# Altium integrated library SubjuGator8.IntLib: 306 symbols (part 2 of 2)
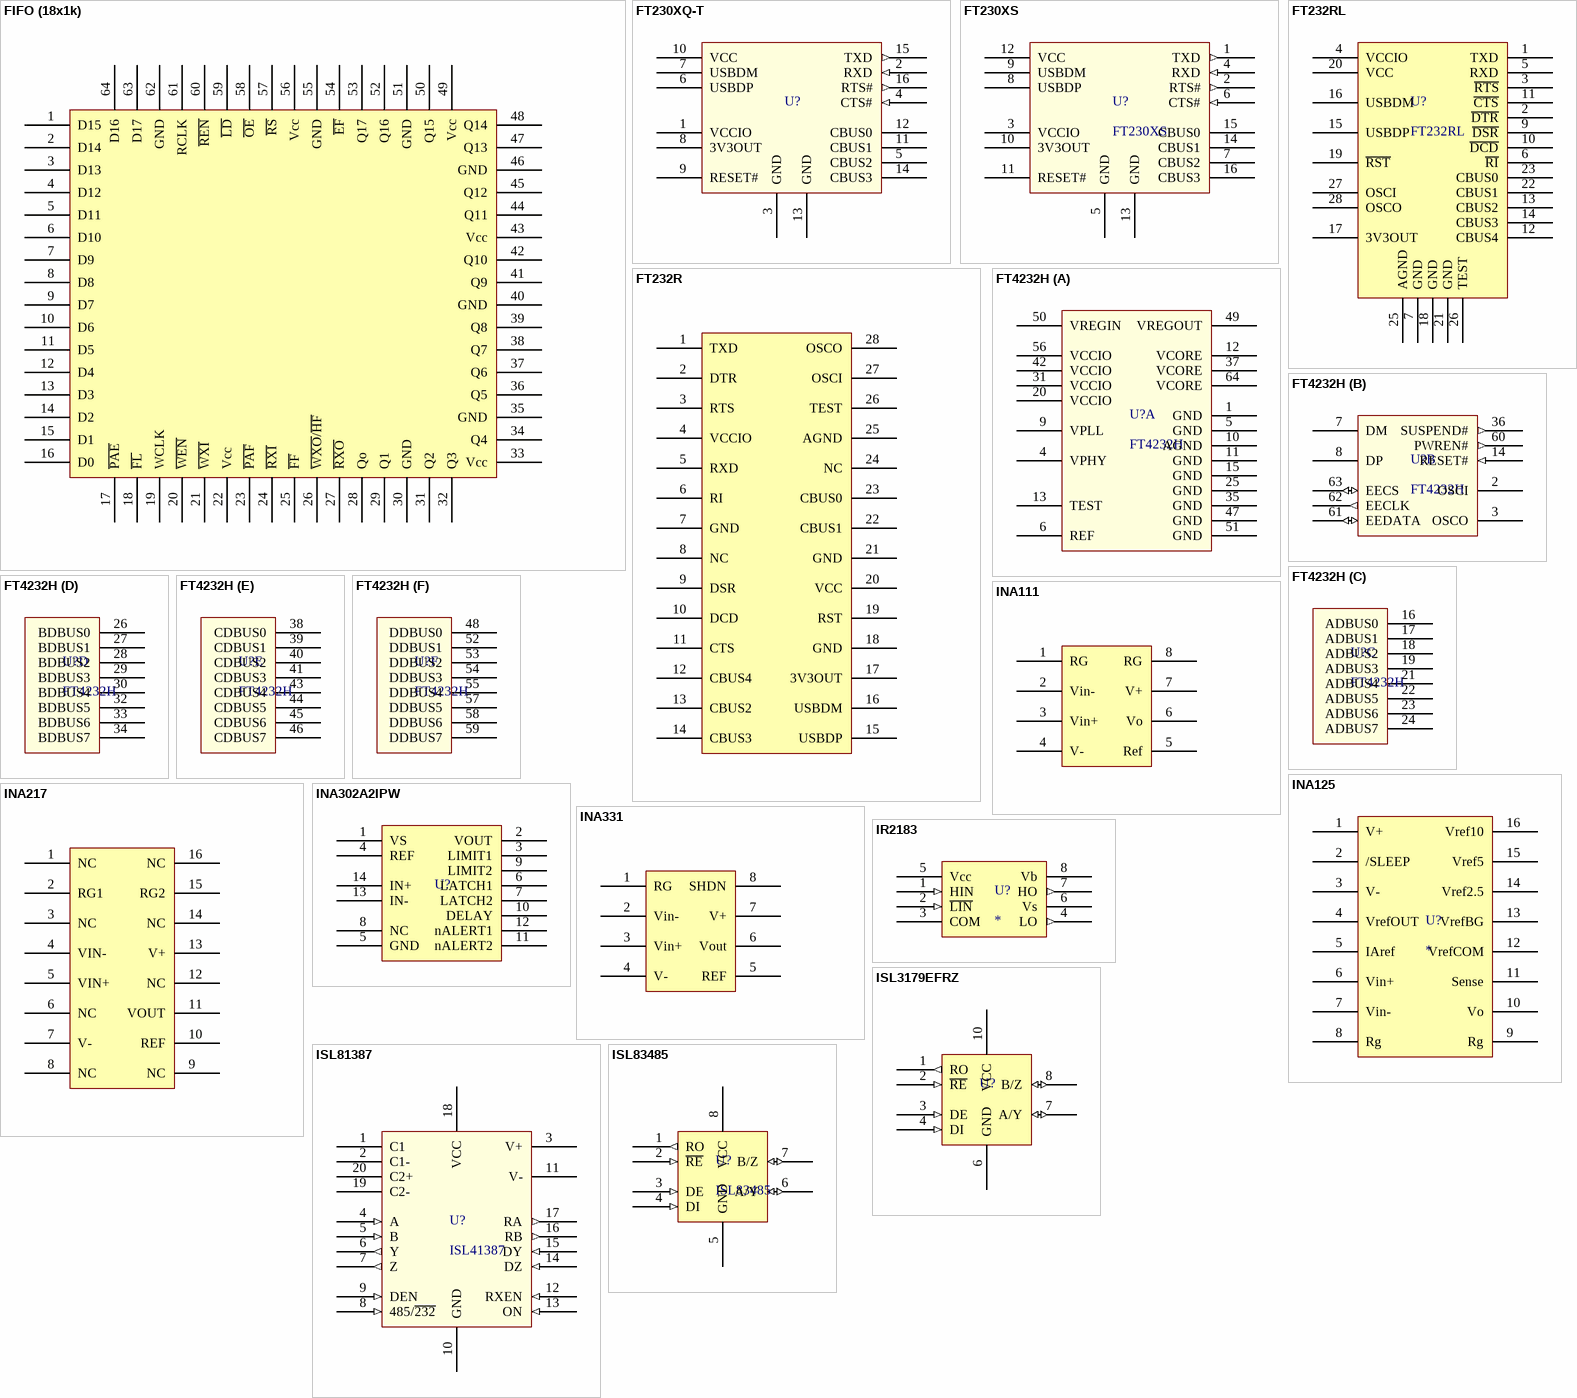
[diagram p15: symbols FIFO (18x1k) to ISL83485]

## FT4232H
designator U?
Quad High Speed USB to Multipurpose UART/MPSSE; Supplier 1: Digi-Key; Supplier Part Number 1: 768-1026-1-ND
footprint FT4232HL (TSQFP, 64-Leads, Body 10.00x10.00mm, Pitch 0.50mm, IPC Medium Density)
part A pins: 1 GND (power), 4 VPHY (power), 5 GND (power), 6 REF, 9 VPLL (power), 10 AGND (power), 11 GND (power), 12 VCORE (power), 13 TEST, 15 GND (power), 20 VCCIO (power), 25 GND (power), 31 VCCIO (power), 35 GND (power), 37 VCORE (power), 42 VCCIO (power), 47 GND (power), 49 VREGOUT (power), 50 VREGIN (power), 51 GND (power), 56 VCCIO (power), 64 VCORE (power)
part B pins: 2 OSCI, 3 OSCO, 7 DM, 8 DP, 14 RESET# (in), 36 SUSPEND# (out), 60 PWREN# (out), 61 EEDATA (io), 62 EECLK (out), 63 EECS (io)
part C pins: 16 ADBUS0, 17 ADBUS1, 18 ADBUS2, 19 ADBUS3, 21 ADBUS4, 22 ADBUS5, 23 ADBUS6, 24 ADBUS7
part D pins: 26 BDBUS0, 27 BDBUS1, 28 BDBUS2, 29 BDBUS3, 30 BDBUS4, 32 BDBUS5, 33 BDBUS6, 34 BDBUS7
part E pins: 38 CDBUS0, 39 CDBUS1, 40 CDBUS2, 41 CDBUS3, 43 CDBUS4, 44 CDBUS5, 45 CDBUS6, 46 CDBUS7
part F pins: 48 DDBUS0, 52 DDBUS1, 53 DDBUS2, 54 DDBUS3, 55 DDBUS4, 57 DDBUS5, 58 DDBUS6, 59 DDBUS7

## INA111
designator U?, comment Instr. Amp
IC OPAMP INSTR 2MHZ 8DIP; Supplier 1: Digi-Key; Supplier Part Number 1: INA111AP-ND
footprint DIP8
pins: 1 RG, 2 Vin-, 3 Vin+, 4 V-, 5 Ref, 6 Vo, 7 V+, 8 RG

## INA125
designator U?
Instrumentation Amplifier; Supplier 1: Digi-Key; Supplier Part Number 1: INA125UA-ND
footprint SOIC127P600X175-16N (SOIC, 16-Leads, Body 9.90x3.90mm, Pitch 1.27mm, IPC Medium Density)
pins: 1 V+, 2 /SLEEP, 3 V-, 4 VrefOUT, 5 IAref, 6 Vin+, 7 Vin-, 8 Rg, 9 Rg, 10 Vo, 11 Sense, 12 VrefCOM, 13 VrefBG, 14 Vref2.5, 15 Vref5, 16 Vref10

## INA217
designator U?
IC OPAMP INSTR 3.4MHZ 16SOIC; Supplier 1: Digi-Key; Supplier Part Number 1: 296-13645-1-ND
footprint SOIC-16
pins: 1 NC, 2 RG1, 3 NC, 4 VIN-, 5 VIN+, 6 NC, 7 V-, 8 NC, 9 NC, 10 REF, 11 VOUT, 12 NC, 13 V+, 14 NC, 15 RG2, 16 NC

## INA302A2IPW
designator U?, comment INA302A2  (value not drawn)
IC CURRENT SENSING AMP 14TSSOP; Manufacturer 1: Texas Instruments; Manufacturer Part Number 1: INA302A2IPW; Supplier 1: Digi-Key; Supplier Part Number 1: 296-46938-ND
footprint INA302A2IPW (IC CURRENT SENSING AMP 14TSSOP)
pins: 1 VS, 2 VOUT, 3 LIMIT1, 4 REF, 5 GND, 6 LATCH1, 7 LATCH2, 8 NC, 9 LIMIT2, 10 DELAY, 11 nALERT2, 12 nALERT1, 13 IN-, 14 IN+

## INA331
designator U?, comment Inst. Amp
IC OPAMP INSTR 2MHZ RRO 8VSSOP; Suplier Part Number 1: 296-12202-1-ND; Supplier 1: Digi-Key
footprint TSSOP-8n
pins: 1 RG, 2 Vin-, 3 Vin+, 4 V-, 5 REF, 6 Vout, 7 V+, 8 SHDN

## IR2183
designator U?
Half-Bridge Driver; Supplier 1: Digi-Key; Supplier Part Number 1: IR2183SPBF-ND
footprint IR2183S
pins: 1 HIN (in), 2 ~{LIN} (in), 3 COM (power), 4 LO (out), 5 Vcc (power), 6 Vs (power), 7 HO (out), 8 Vb

## ISL3179EFRZ
designator U?  (value not drawn)
TXRX ESD 3.3V RS-485/422 10-DFN; Supplier 1: Digi-Key; Supplier Part Number 1: ISL3179EFRZ-ND
footprint ISL3179EFRZ (TXRX ESD 3.3V RS-485/422 10-DFN)
footprint ISL3179EFRZ_NO_VIAS (TXRX ESD 3.3V RS-485/422 10-DFN)
pins: 1 RO (out), 2 ~{RE} (in), 3 DE (in), 4 DI (in), 6 GND (power), 7 A/Y (io), 8 B/Z (io), 10 VCC (power)

## ISL81387
designator U?, comment ISL41387
5V RS-232/RS-485 Transceiver
footprint ISL81387IAZ (SOP, 20-Leads, Body 7.3x5.4mm (max), Pitch 0.65mm, IPC Medium Density)
pins: 1 C1, 2 C1-, 3 V+, 4 A (in), 5 B (in), 6 Y (out), 7 Z (out), 8 485/~{232} (in), 9 DEN (in), 10 GND (power), 11 V-, 12 RXEN (in), 13 ON (in), 14 DZ (in), 15 DY (in), 16 RB (out), 17 RA (out), 18 VCC (power), 19 C2-, 20 C2+

## ISL83485
designator U?
3.3V RS485 Transceiver; Supplier 1: Digi-Key; Supplier Part Number 1: ISL83485IBZ-ND
footprint ISL8348xIBZ (SOIC, 8-Leads, Body 4.90x3.90mm, Pitch 1.27mm, IPC Medium Density)
pins: 1 RO (out), 2 ~{RE} (in), 3 DE (in), 4 DI (in), 5 GND (power), 6 A/Y (io), 7 B/Z (io), 8 VCC (power)

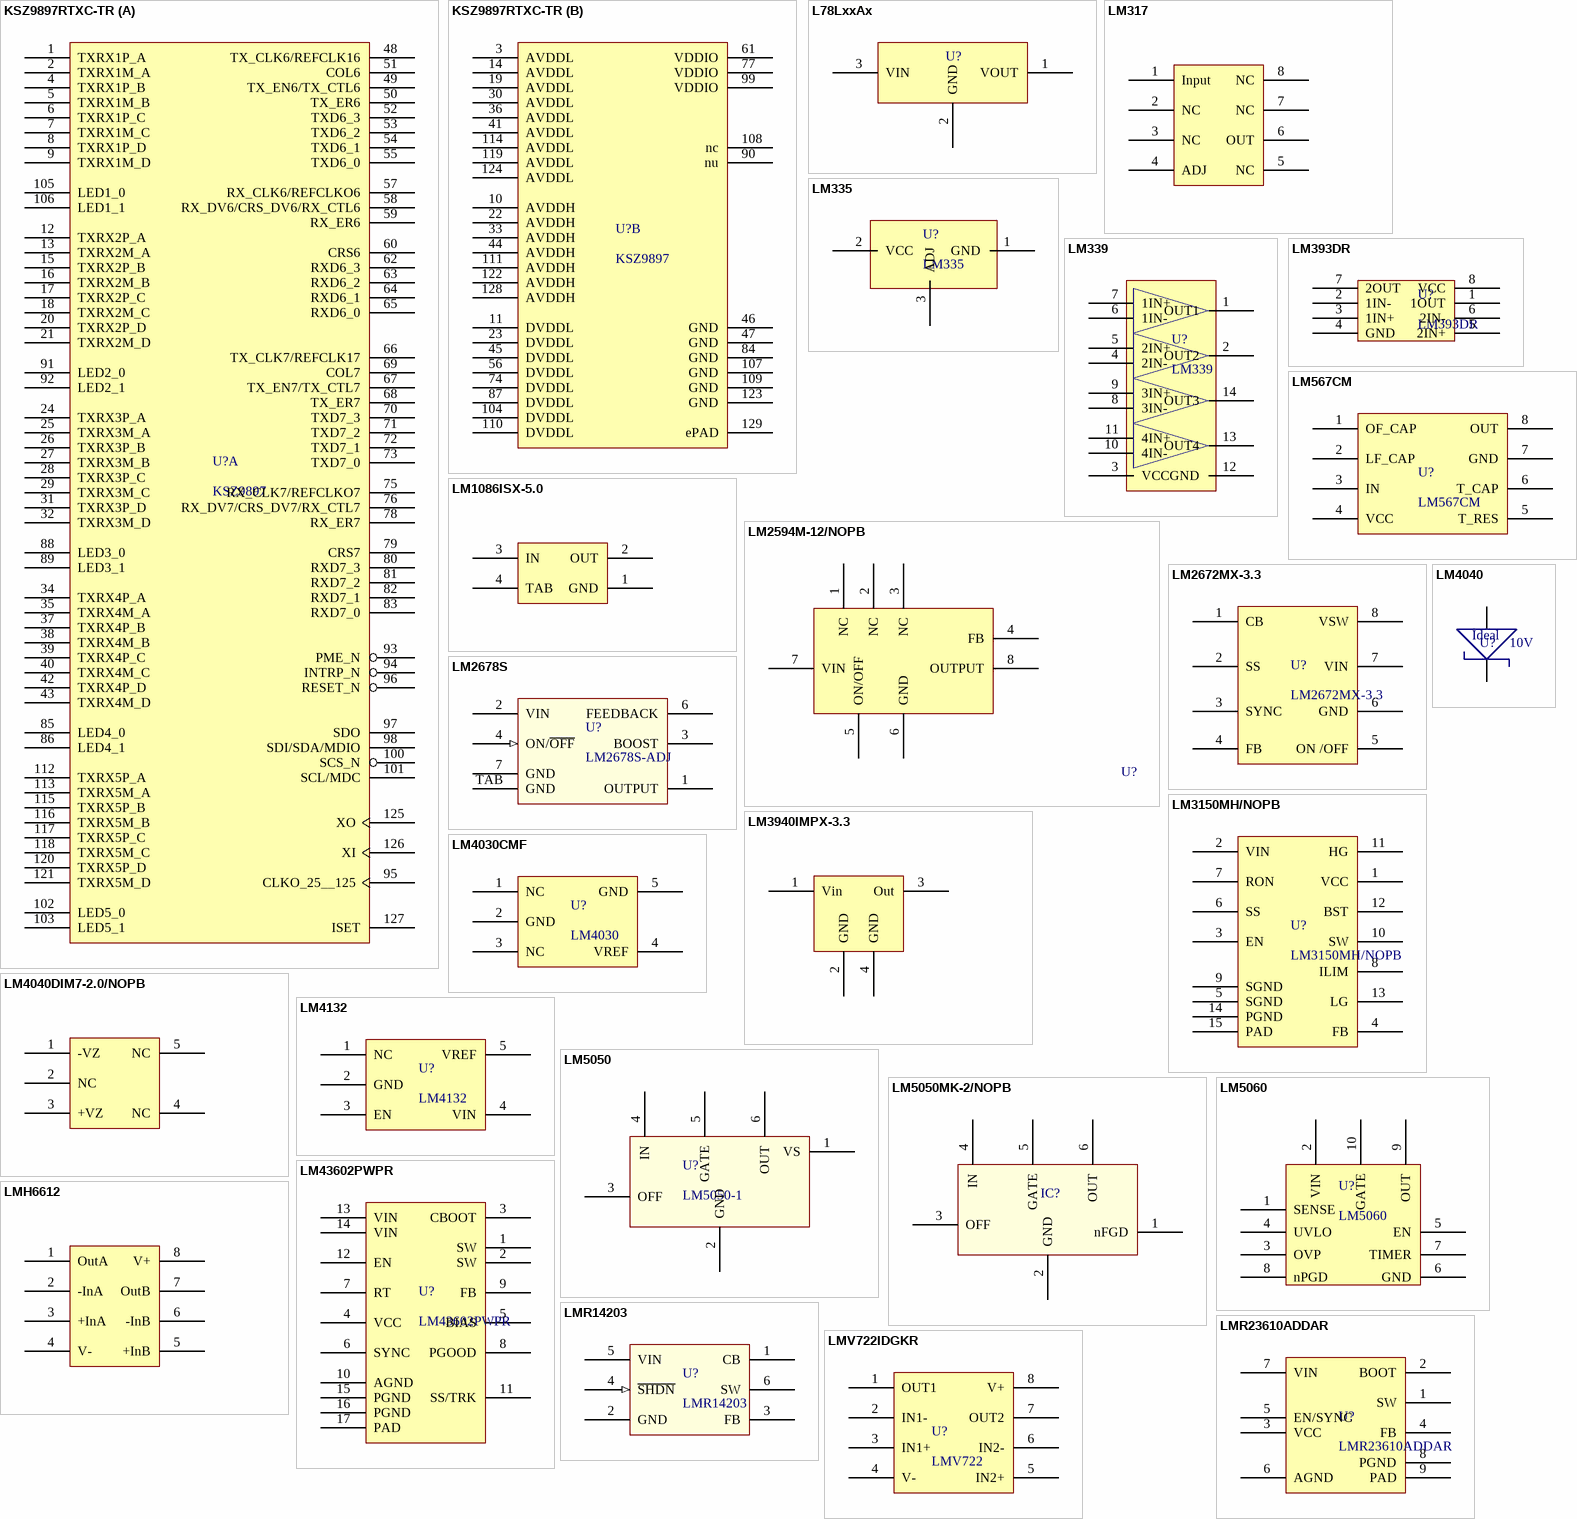
[diagram p6: symbols KSZ9897RTXC-TR to LMV722IDGKR]

## KSZ9897RTXC-TR
designator U?, comment KSZ9897
Ethernet Switch 10/100/1000 Base-T PHY I²C, SPI Interface 128-TQFP (14x14); Supplier 1: Digi-Key; Supplier Part Number 1: KSZ9897RTXC-CT-ND
footprint 128-TQFP (TSQFP, 128-Leads, Body 14.00x14.00mm, Pitch 0.40mm, Thermal Pad 6.50x6.50mm, IPC Medium Density)
part A pins: 1 TXRX1P_A, 2 TXRX1M_A, 4 TXRX1P_B, 5 TXRX1M_B, 6 TXRX1P_C, 7 TXRX1M_C, 8 TXRX1P_D, 9 TXRX1M_D, 12 TXRX2P_A, 13 TXRX2M_A, 15 TXRX2P_B, 16 TXRX2M_B, 17 TXRX2P_C, 18 TXRX2M_C, 20 TXRX2P_D, 21 TXRX2M_D, 24 TXRX3P_A, 25 TXRX3M_A, 26 TXRX3P_B, 27 TXRX3M_B, 28 TXRX3P_C, 29 TXRX3M_C, 31 TXRX3P_D, 32 TXRX3M_D, 34 TXRX4P_A, 35 TXRX4M_A, 37 TXRX4P_B, 38 TXRX4M_B, 39 TXRX4P_C, 40 TXRX4M_C, 42 TXRX4P_D, 43 TXRX4M_D, 48 TX_CLK6/REFCLK16, 49 TX_EN6/TX_CTL6, 50 TX_ER6, 51 COL6, 52 TXD6_3, 53 TXD6_2, 54 TXD6_1, 55 TXD6_0, 57 RX_CLK6/REFCLKO6, 58 RX_DV6/CRS_DV6/RX_CTL6, 59 RX_ER6, 60 CRS6, 62 RXD6_3, 63 RXD6_2, 64 RXD6_1, 65 RXD6_0, 66 TX_CLK7/REFCLK17, 67 TX_EN7/TX_CTL7, 68 TX_ER7, 69 COL7, 70 TXD7_3, 71 TXD7_2, 72 TXD7_1, 73 TXD7_0, 75 RX_CLK7/REFCLKO7, 76 RX_DV7/CRS_DV7/RX_CTL7, 78 RX_ER7, 79 CRS7, 80 RXD7_3, 81 RXD7_2, 82 RXD7_1, 83 RXD7_0, 85 LED4_0, 86 LED4_1, 88 LED3_0, 89 LED3_1, 91 LED2_0, 92 LED2_1, 93 PME_N, 94 INTRP_N, 95 CLKO_25__125, 96 RESET_N, 97 SDO, 98 SDI/SDA/MDIO, 100 SCS_N, 101 SCL/MDC, 102 LED5_0, 103 LED5_1, 105 LED1_0, 106 LED1_1, 112 TXRX5P_A, 113 TXRX5M_A, 115 TXRX5P_B, 116 TXRX5M_B, 117 TXRX5P_C, 118 TXRX5M_C, 120 TXRX5P_D, 121 TXRX5M_D, 125 XO, 126 XI, 127 ISET
part B pins: 3 AVDDL, 10 AVDDH, 11 DVDDL, 14 AVDDL, 19 AVDDL, 22 AVDDH, 23 DVDDL, 30 AVDDL, 33 AVDDH, 36 AVDDL, 41 AVDDL, 44 AVDDH, 45 DVDDL, 46 GND, 47 GND, 56 DVDDL, 61 VDDIO, 74 DVDDL, 77 VDDIO, 84 GND, 87 DVDDL, 90 nu, 99 VDDIO, 104 DVDDL, 107 GND, 108 nc, 109 GND, 110 DVDDL, 111 AVDDH, 114 AVDDL, 119 AVDDL, 122 AVDDH, 123 GND, 124 AVDDL, 128 AVDDH, 129 ePAD

## L78LxxAx
designator U?, comment L78L15AC  (value not drawn)
Positive Voltage Regulator; Supplier 1: Digi-Key; Supplier Part Number 1: 497-13129-ND
footprint L78LxxAxZ (Positive voltage regulator TO-92)
footprint L78LxxAxUTR (SOT89, 3-Leads, Body 4.50x2.45mm, Pitch 1.50mm, Lead Span 4.1mm, IPC Medium Density)
pins: 1 VOUT, 2 GND (power), 3 VIN

## LM317
designator U?
IC REG LDO ADJ 0.1A 8SOIC; Supplier 1: Digi-Key; Supplier Part Number 1: 296-26092-5-ND
footprint SOIC-8N (LM317 Footprint)
pins: 1 Input, 2 NC, 3 NC, 4 ADJ, 5 NC, 6 OUT, 7 NC, 8 NC

## LM335
designator U?
IC SENSOR PRECISION TEMP TO92-3; Supplier: Digikey; Supplier Part Number: LM335ZNS/NOPB-ND
footprint LM335 (IC SENSOR PRECISION TEMP TO92-3)
pins: 1 GND, 2 VCC, 3 ADJ

## LM339
designator U?
IC QUAD DIFF COMPARATOR 14-TSSOP; Supplier 1: Digi-Key; Supplier Part Number 1: 296-18454-1-ND
footprint LM339 (TSOP, 14-Leads, Body 5.00x4.40mm, Pitch 0.65mm, IPC Medium Density)
pins: 1 OUT1, 2 OUT2, 3 VCC, 4 2IN-, 5 2IN+, 6 1IN-, 7 1IN+, 8 3IN-, 9 3IN+, 10 4IN-, 11 4IN+, 12 GND, 13 OUT4, 14 OUT3

## LM393DR
designator U?
LM393DR Comparator; Supplier 1: Digi-key; Supplier Part Number 1: 296-1015-1-ND
footprint LM393DR
pins: 1 1OUT, 2 1IN-, 3 1IN+, 4 GND, 5 2IN+, 6 2IN-, 7 2OUT, 8 VCC

## LM567CM
designator U?
IC TONE DECODR PHAS LOC LP 8SOIC; Supplier Part Number 1: LM567CM/NOPB-ND; Supplier 1: Digi-Key
footprint SOIC-8PIN (For 296-1345-1-ND)
pins: 1 OF_CAP, 2 LF_CAP, 3 IN, 4 VCC, 5 T_RES, 6 T_CAP, 7 GND, 8 OUT

## LM1086ISX-5.0
designator U?, comment 5V LDO Regulator
IC REG LDO 5V 1.5A DDPAK; Supplier Part Number 1: LM1086ISX-5.0/NOPBCT-ND; Supplier 1: Digi-Key
footprint DPAK254P1435X464-4N (D2-PAK, 4-Pads, Body 7.55x8.56mm (max), IPC Medium Density)
pins: 1 GND, 2 OUT, 3 IN, 4 TAB

## LM2594M-12/NOPB
designator U?  (value not drawn)
IC REG BUCK 12V 0.5A 8-SOIC; Supplier 1: Digi-Key; Supplier Part Number 1: LM2594M-12/NOPB-ND
footprint LM2594M-12/NOPB (IC REG BUCK 12V 0.5A 8-SOIC)
pins: 1 NC, 2 NC, 3 NC, 4 FB, 5 ON/OFF, 6 GND, 7 VIN, 8 OUTPUT

## LM2672MX-3.3
designator U?
IC REG BUCK 3.3V 1A 8-SOIC; Manufacturer: Microchip; Manufacturer Part Number: LM2672MX-3.3; Supplier 1: Digi-Key; Supplier 1 Part Number: 296-35408-1-ND
footprint 8-SOIC (Used for LMH6612)
pins: 1 CB, 2 SS, 3 SYNC, 4 FB, 5 ON /OFF, 6 GND, 7 VIN, 8 VSW

## LM2678S
designator U?, comment LM2678S-ADJ
Simple Switcher High Efficiency 5A Step-Down Voltage Regulator; Supplier 1: Digi-Key; Supplier Part Number 1: LM2678SX-ADJ/NOPBCT-ND
footprint LM2678S
pins: 1 OUTPUT, 2 VIN (power), 3 BOOST, 4 ON/~{OFF} (in), 6 FEEDBACK (power), 7 GND (power), TAB GND (power)

## LM3150MH/NOPB
designator U?
IC REG CTRLR BUCK 14TSSOP; Manufacturer 1: Texas Instruments; Manufacturer Part Number 1: LM3150MH/NOPB; Supplier Part Number 1: LM3150MH/NOPB-ND; Supplier 1: Digi-Key
footprint TSSOP-14 EP (TSOP, 14-Leads, Body 5.00x4.40mm, Pitch 0.65mm, Thermal Pad 3.10x3.00mm, IPC Medium Density)
pins: 1 VCC, 2 VIN, 3 EN, 4 FB, 5 SGND, 6 SS, 7 RON, 8 ILIM, 9 SGND, 10 SW, 11 HG, 12 BST, 13 LG, 14 PGND, 15 PAD

## LM3940IMPX-3.3
designator U?, comment 3.3V LDO Reg
IC REG LDO 3.3V 1A SOT223; Supplier 1: Digi-Key; Supplier Part Number 1: LM3940IMPX-3.3/NOPBCT-ND
footprint SOT23-4n (SOT223, 4-Leads, Body 6.50x7.00mm (avg), Pitch 2.30mm, IPC Medium Density)
pins: 1 Vin, 2 GND, 3 Out, 4 GND

## LM4030CMF
designator U?, comment LM4030
LM4030CMF-2.5/NOPB; Supplier 1: Digi-Key; Supplier Part Number 1: LM4030CMF-2.5/NOPBCT-ND
footprint SOT23-5 (Used for LP2992)
pins: 1 NC, 2 GND, 3 NC, 4 VREF, 5 GND

## LM4040
designator U?  Reverse Breakdown Voltage: 10V  (hidden comment: LM4040)
LM4040AIM3-10.0/NOPBCT; Supplier 1: Digi-Key; Supplier Part Number 1: LM4040AIM3-10.0/NOPBCT-ND
footprint LM4040 (SOT23, 3-Leads, Body 2.92x2.37mm, Pitch 0.95mm, IPC Medium Density)
pins: 1 Anode, 2 Cathode
text: Ideal

## LM4040DIM7-2.0/NOPB
designator U?, comment VRef 2.048V
IC VREF SHUNT 2.048V SC70; Supplier 1: Digi-Key; Supplier Part Number 1: 296-38736-1-ND
footprint SOT35-5pin (For 296-38736-1-ND)
pins: 1 -VZ, 2 NC, 3 +VZ, 4 NC, 5 NC

## LM4132
designator U?
IC VREF SERIES 2.5V SOT23-5; Supplier 1: Digi-Key; Supplier Part Number 1: LM4132AMF-2.5/NOPBCT-ND
footprint SOT23-5 (Used for LP2992)
pins: 1 NC, 2 GND, 3 EN, 4 VIN, 5 VREF

## LM5050
designator U?, comment LM5050-1
High-Side OR-ing FET Controller; Supplier 1: Digi-Key; Supplier Part Number 1: LM5050MK-1/NOPBCT-ND
footprint LM5050 (SOT23, 6-Leads, Body 2.90x2.80mm, Pitch 0.95mm, IPC Medium Density)
pins: 1 VS, 2 GND, 3 OFF, 4 IN, 5 GATE, 6 OUT

## LM5050MK-2/NOPB
designator IC?  (value not drawn)
IC OR CTRLR N+1 6SOT; Supplier 1: Digi-Key; Supplier Part Number 1: LM5050MK-2/NOPBDKR-ND
footprint LM5050MK-2/NOPB (IC OR CTRLR N+1 6SOT)
pins: 1 nFGD, 2 GND, 3 OFF, 4 IN, 5 GATE, 6 OUT

## LM5060
designator U?
Hotswap Controller; Supplier 1: Digi-Key; Supplier Part Number 1: LM5060Q1MM/NOPBCT-ND
footprint LM5060 (10-VSSOP)
pins: 1 SENSE, 2 VIN, 3 OVP, 4 UVLO, 5 EN, 6 GND, 7 TIMER, 8 nPGD, 9 OUT, 10 GATE

## LM43602PWPR
designator U?
IC REG BUCK ADJ 2A SYNC 16HTSSOP; Manufacturer 1: Texas Instruments; Manufacturer Part Number 1: LM43602PWPR; Supplier Part Number 1: 296-37754-1-ND; Supplier 1: Digi-Key
footprint TSSOP-16 EP (TSOP, 16-Leads, Body 5.00x4.40mm, Pitch 0.65mm, Thermal Pad 3.29x2.41mm, IPC Medium Density)
pins: 1 SW, 2 SW, 3 CBOOT, 4 VCC, 5 BIAS, 6 SYNC, 7 RT, 8 PGOOD, 9 FB, 10 AGND, 11 SS/TRK, 12 EN, 13 VIN, 14 VIN, 15 PGND, 16 PGND, 17 PAD

## LMH6612
designator U?
IC OPAMP GP 130MHZ RRO 8SOIC; Supplier Part Number 1: LMH6612MA/NOPB-ND; Supplier 1: Digi-Key
footprint 8-SOIC (Used for LMH6612)
pins: 1 OutA, 2 -InA, 3 +InA, 4 V-, 5 +InB, 6 -InB, 7 OutB, 8 V+

## LMR14203
designator U?
Simple Switcher 42Vin 0.3A Step-Down Voltage Regulator; Supplier 1: Digi-Key; Supplier Part Number 1: LMR14203XMKE/NOPBCT-ND
footprint SOT95P280X110-6N (SOT23, 6-Leads, Body 2.90x2.80mm, Pitch 0.95mm, IPC Medium Density)
pins: 1 CB, 2 GND (power), 3 FB, 4 ~{SHDN} (in), 5 VIN, 6 SW

## LMR23610ADDAR
designator U?
IC REG BUCK ADJ 1A SYNC 8SOPWRPD; Manufacturer 1: Texas Instruments; Supplier 1: Digi-Key; Supplier Part Number 1: 296-47267-1-ND; Manufacturer Part Number 1: LMR23610ADDAR; ComponentLink1URL: http://www.ti.com/lit/ds/symlink/lmr23610.pdf; ComponentLink1Description: Datasheet; ComponentLink2URL: http://www.ti.com/product/LMR23610/description; ComponentLink2Description: Web Site
footprint LMR23610ADDAR (IC REG BUCK ADJ 1A SYNC 8SOPWRPD)
footprint LMR23610ADDAR (IC REG BUCK ADJ 1A SYNC 8SOPWRPD)
pins: 1 SW, 2 BOOT, 3 VCC, 4 FB, 5 EN/SYNC, 6 AGND, 7 VIN, 8 PGND, 9 PAD

## LMV722IDGKR
designator U?, comment LMV722
IC OPAMP GP 10MHZ RRO 8VSSOP; Supplier 1: Digi-Key; Supplier Part Number 1: 296-27988-1-ND
footprint TSSOP-8N(2) (For LMV722)
pins: 1 OUT1, 2 IN1-, 3 IN1+, 4 V-, 5 IN2+, 6 IN2-, 7 OUT2, 8 V+

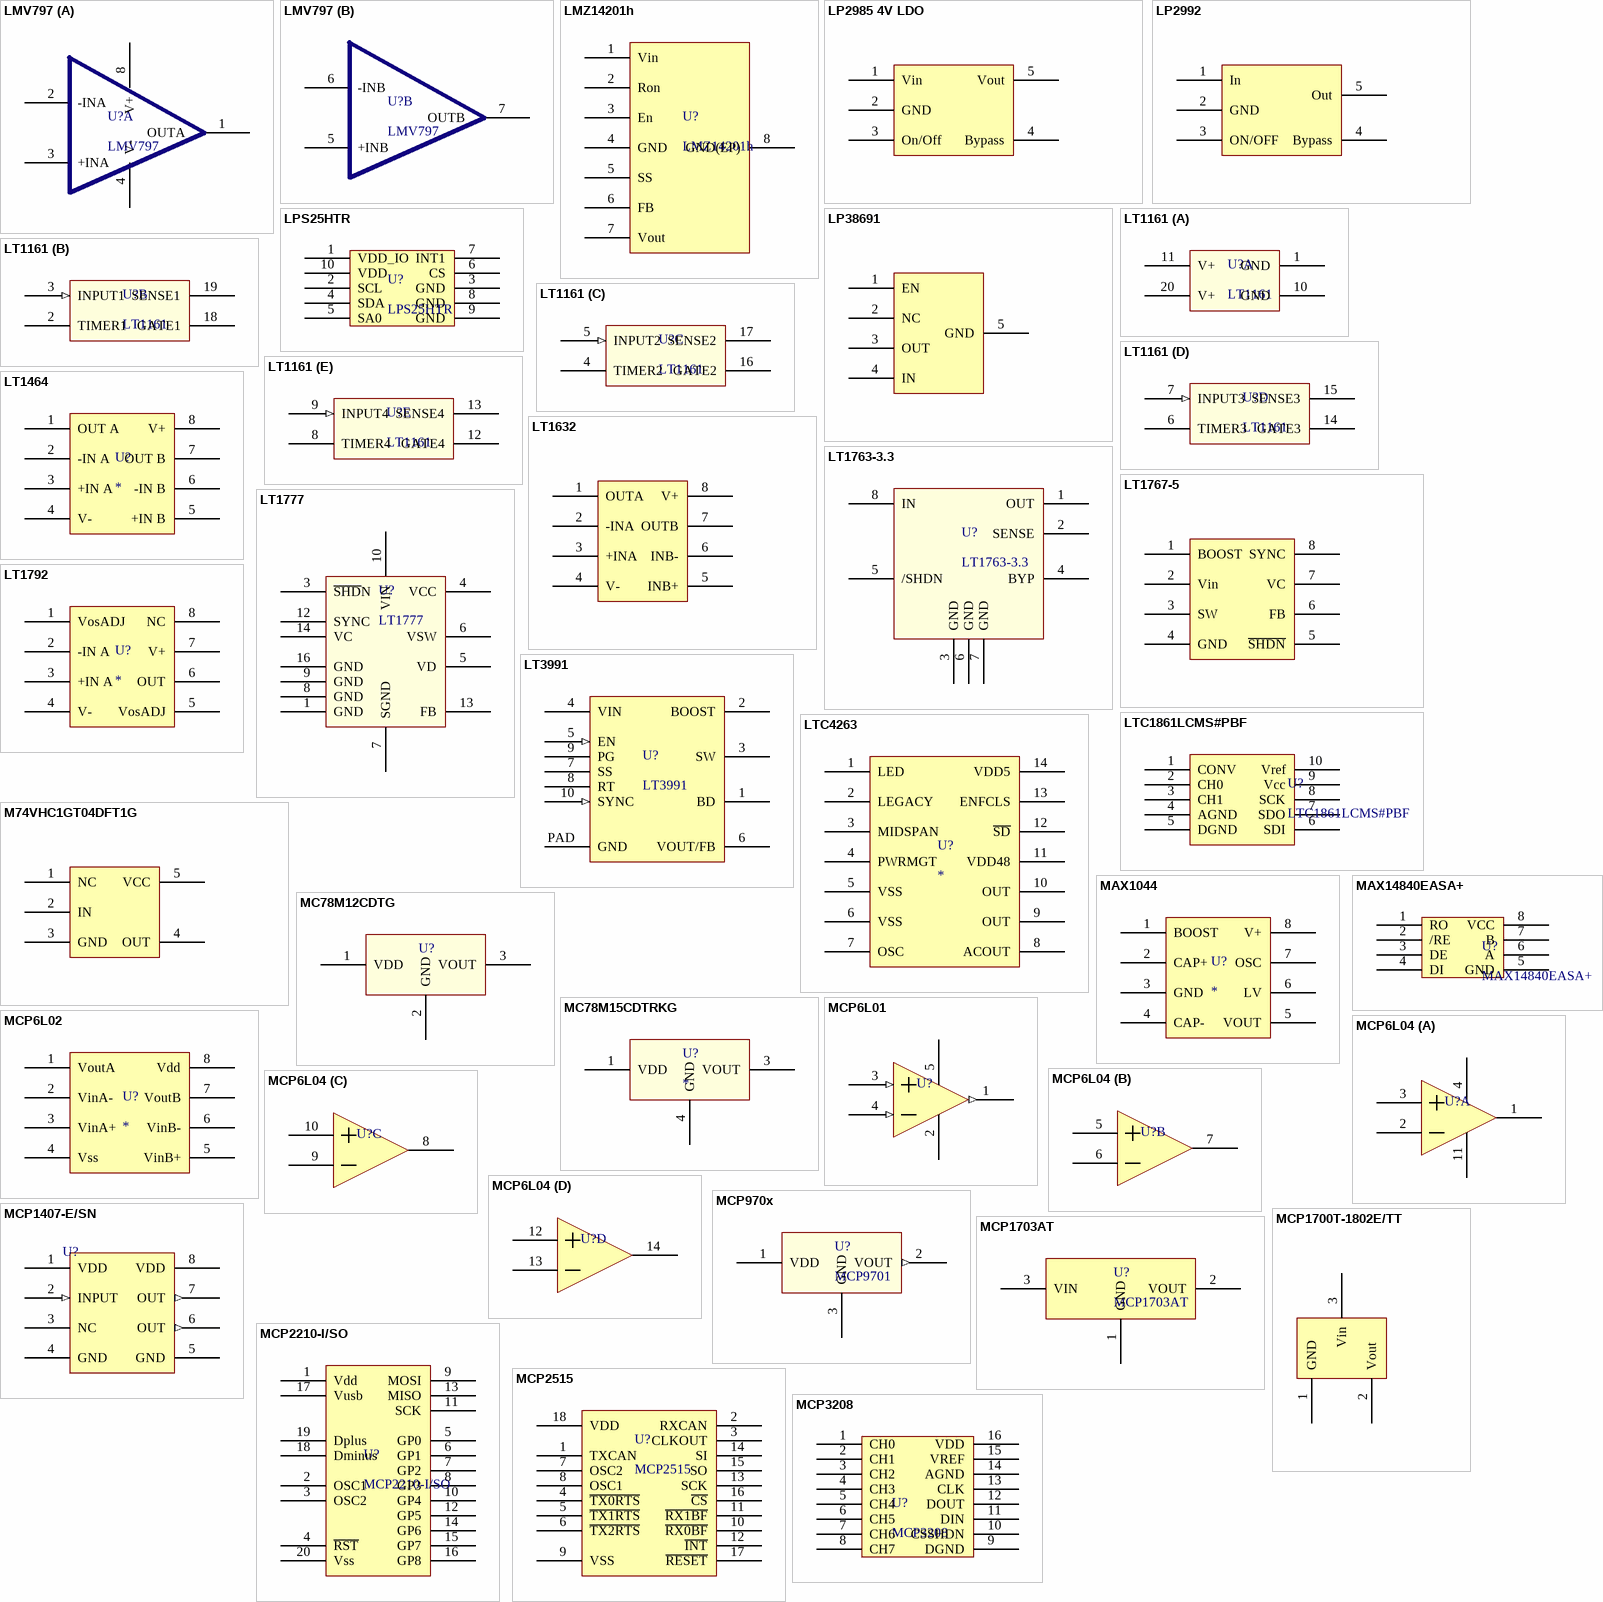
[diagram p7: symbols LMV797 to MCP3208]

## LMV797
designator U?
IC OPAMP GP 17MHZ RRO 8VSSOP; Supplier 1: Digi-Key; Supplier Part Number 1: LMV797MM/NOPBCT-ND
footprint TSSOP-8N
part A pins: 1 OUTA   , 2 -INA, 3 +INA, 4 V-, 8 V+
part B pins: 5 +INB, 6 -INB, 7 OUTB   

## LMZ14201h
designator U?
IC BUCK SYNC ADJ 1A TO-PMOD-7; Supplier 1: Digi-Key; Supplier Part Number 1: LMZ14201HTZX/NOPBCT-ND
footprint TO-PMOD-7 (For LMZ14201h)
pins: 1 Vin, 2 Ron, 3 En, 4 GND, 5 SS, 6 FB, 7 Vout, 8 GND(EP)

## LP2985 4V LDO
designator U?, comment 4V LDO
IC REG LDO 4V 0.15A SOT23-5; Supplier 1: Digi-Key; Supplier Part Number 1: LP2985IM5-4.0/NOPBCT-ND
footprint SOT23-5pin (For LP2985IM5-4.0/NOPBCT-ND)
pins: 1 Vin, 2 GND, 3 On/Off, 4 Bypass, 5 Vout

## LP2992
designator U?
IC REG LDO 5V 0.25A SOT23-5; Supplier 1: Digi-Key; Supplier Part Number 1: LP2992IM5-5.0/NOPBCT-ND
footprint SOT23-5 (Used for LP2992)
pins: 1 In, 2 GND, 3 ON/OFF, 4 Bypass, 5 Out

## LP38691
designator U?, comment 3.3V LDO REG
IC REG LDO 3.3V 0.5A SOT223-5; Supplier 1: Digi-Key; Supplier Part Number 1: LP38693MP-3.3/NOPBCT-ND
footprint SOT223-8N (3.3V LDO)
pins: 1 EN, 2 NC, 3 OUT, 4 IN, 5 GND

## LPS25HTR
designator U?
IC MEMS PRESSURE SENSOR 10HCLGA; Supplier: Digikey; Supplier Part Number: 497-14380-1-ND
footprint LPS25HTR (IC MEMS PRESSURE SENSOR 10HCLGA)
pins: 1 VDD_IO, 2 SCL, 3 GND, 4 SDA, 5 SA0, 6 CS, 7 INT1, 8 GND, 9 GND, 10 VDD

## LT1161
designator U?
Quad Protected High-Side MOSFET Driver; Supplier 1: Digi-Key; Supplier Part Number 1: LT1161CSW#PBF-ND
part A pins: 1 GND (power), 10 GND (power), 11 V+ (power), 20 V+
part B pins: 2 TIMER1, 3 INPUT1 (in), 18 GATE1, 19 SENSE1
part C pins: 4 TIMER2, 5 INPUT2 (in), 16 GATE2, 17 SENSE2
part D pins: 6 TIMER3, 7 INPUT3 (in), 14 GATE3, 15 SENSE3
part E pins: 8 TIMER4, 9 INPUT4 (in), 12 GATE4, 13 SENSE4

## LT1464
designator U?
IC OPAMP JFET 1MHZ 8SO; Supplier 1: Digi-Key; Supplier Part Number 1: LT1464CS8#PBF-ND
footprint SOIC-8N (LM317 Footprint)
pins: 1 OUT A, 2 -IN A, 3 +IN A, 4 V-, 5 +IN B, 6 -IN B, 7 OUT B, 8 V+

## LT1632
designator U?
IC OPAMP GP 45MHZ RRO 8SO; Supplier 1: Digi-Key; Supplier Part Number 1: LT1632CS8#PBF-ND
footprint SOIC127P600-8N (For LT1632)
pins: 1 OUTA, 2 -INA, 3 +INA, 4 V-, 5 INB+, 6 INB-, 7 OUTB, 8 V+

## LT1763-3.3
designator U?
IC REG LDO 3.3V 0.5A 8SOIC; Manufacturer 1: Linear Technology; Manufacturer Part Number 1: LT1763CS8-3.3#TRPBF; Supplier 1: Digi-Key; Supplier Part Number 1: LT1763CS8-3.3#TRPBFCT-ND
footprint 8-SOIC (Used for LMH6612)
pins: 1 OUT, 2 SENSE, 3 GND, 4 BYP, 5 /SHDN, 6 GND, 7 GND, 8 IN

## LT1767-5
designator U?
IC REG BUCK 5V 1.5A 8MSOP; Supplier 1: Digi-Key; Supplier Part Number 1: LT1767EMS8-5#PBF-ND
footprint MSOP-8n (LT1767)
pins: 1 BOOST, 2 Vin, 3 SW, 4 GND, 5 ~{SHDN}, 6 FB, 7 VC, 8 SYNC

## LT1777
designator U?
Low Noise Step-Down Switching Regulator; Supplier 1: Digi-Key; Supplier Part Number 1: LT1777CS#PBF-ND
pins: 1 GND (power), 3 ~{SHD}N, 4 VCC (power), 5 VD, 6 VSW, 7 SGND (power), 8 GND (power), 9 GND (power), 10 VIN (power), 12 SYNC, 13 FB, 14 VC, 16 GND (power)

## LT1792
designator U?
IC OPAMP JFET 5.6MHZ 8SO; Supplier 1: Digi-Key; Supplier Part Number 1: LT1792CS8#PBF-ND
footprint SOIC-8N (LM317 Footprint)
pins: 1 VosADJ, 2 -IN A, 3 +IN A, 4 V-, 5 VosADJ, 6 OUT, 7 V+, 8 NC

## LT3991
designator U?
55V, 1.2A Step-Down Regulator with 2.8uA Quiescent Current; Supplier 1: Digi-Key; Supplier Part Number 1: LT3991EMSE#PBF-ND
footprint LTS3991MSE (TSSOP, 10-Leads, Body 3.1x3.1mm (max), Pitch 0.50mm, IPC Medium Density)
footprint LT3991DD (QFN, 10-Leads, Body 3.00x3.00mm, Pitch 0.50mm, Thermal Pad 2.38x1.65mm, IPC Medium Density)
pins: 1 BD, 2 BOOST, 3 SW, 4 VIN (power), 5 EN (in), 6 VOUT/FB, 7 SS, 8 RT, 9 PG (oc), 10 SYNC (in), PAD GND

## LTC1861LCMS#PBF
designator U?
IC ADC 2CH 12B 3V 150KSPS 10MSOP; Supplier 1: Digi-Key; Supplier Part Number 1: LTC1861LCMS#PBF-ND
footprint LTC1861LCMS#PBF (TSSOP, 10-Leads, Body 3.00x3.00mm, Pitch 0.50mm, IPC Medium Density)
pins: 1 CONV, 2 CH0, 3 CH1, 4 AGND, 5 DGND, 6 SDI, 7 SDO, 8 SCK, 9 Vcc, 10 Vref

## LTC4263
designator U?
IC POE 803.2AF SINGL PSE 14-SOIC; Supplier 1: Digi-Key; Supplier Part Number 1: LTC4263CS#PBF-ND
footprint LTC4263 (Single IEEE 802.3af Compliant PSE Controller with Internal Switch)
pins: 1 LED, 2 LEGACY, 3 MIDSPAN, 4 PWRMGT, 5 VSS, 6 VSS, 7 OSC, 8 ACOUT, 9 OUT, 10 OUT, 11 VDD48, 12 ~{SD}, 13 ENFCLS, 14 VDD5

## M74VHC1GT04DFT1G
designator U?, comment Level Shifter
IC GATE INVERTER SNGL 1IN SOT353; Supplier Part Number 1: M74VHC1GT04DFT1GOSCT-ND; Supplier 1: Digi-Key
footprint SOT23127P600-8N (Logic Level Shifter)
pins: 1 NC, 2 IN, 3 GND, 4 OUT, 5 VCC

## MAX1044
designator U?
IC REG SWTCHD CAP INV 20MA 8SOIC; Supplier 1: Digi-Key; Supplier Part Number 1: MAX1044CSA+-ND
footprint SOIC-8N (LM317 Footprint)
pins: 1 BOOST, 2 CAP+, 3 GND, 4 CAP-, 5 VOUT, 6 LV, 7 OSC, 8 V+

## MAX14840EASA+
designator U?
TXRX 40MBPS RS485/RS422 8-SOIC; Supplier 1: Digi-Key; Supplier Part Number 1: MAX14840EASA+-ND
footprint MAX14840EASA+ (SOIC, 8-Leads, Body 4.90x3.90mm, Pitch 1.27mm, IPC Medium Density)
pins: 1 RO, 2 /RE, 3 DE, 4 DI, 5 GND, 6 A, 7 B, 8 VCC

## MC78M12CDTG
designator U?  (value not drawn)
IC REG LDO 12V 0.5A DPAK; Supplier 1: Digi-Key; Supplier Part Number 1: MC78M12CDTGOS-ND
footprint MC78M12CDTG (IC REG LDO 12V 0.5A DPAK)
pins: 1 VDD (power), 2 GND (power), 3 VOUT (power)